# Altium footprint library PCB Library.PcbLib: 32 footprints (part 1 of 2)
Each footprint in its own frame and in the unit in brackets; x right, y up, seen from the top. Pads: shape width x height; smd on the part's side, far side on the other; paste and mask are expansions set on the pad; w line width, h text height; cw(c..) or ccw(c..) is an arc to the next point about the centre after c.
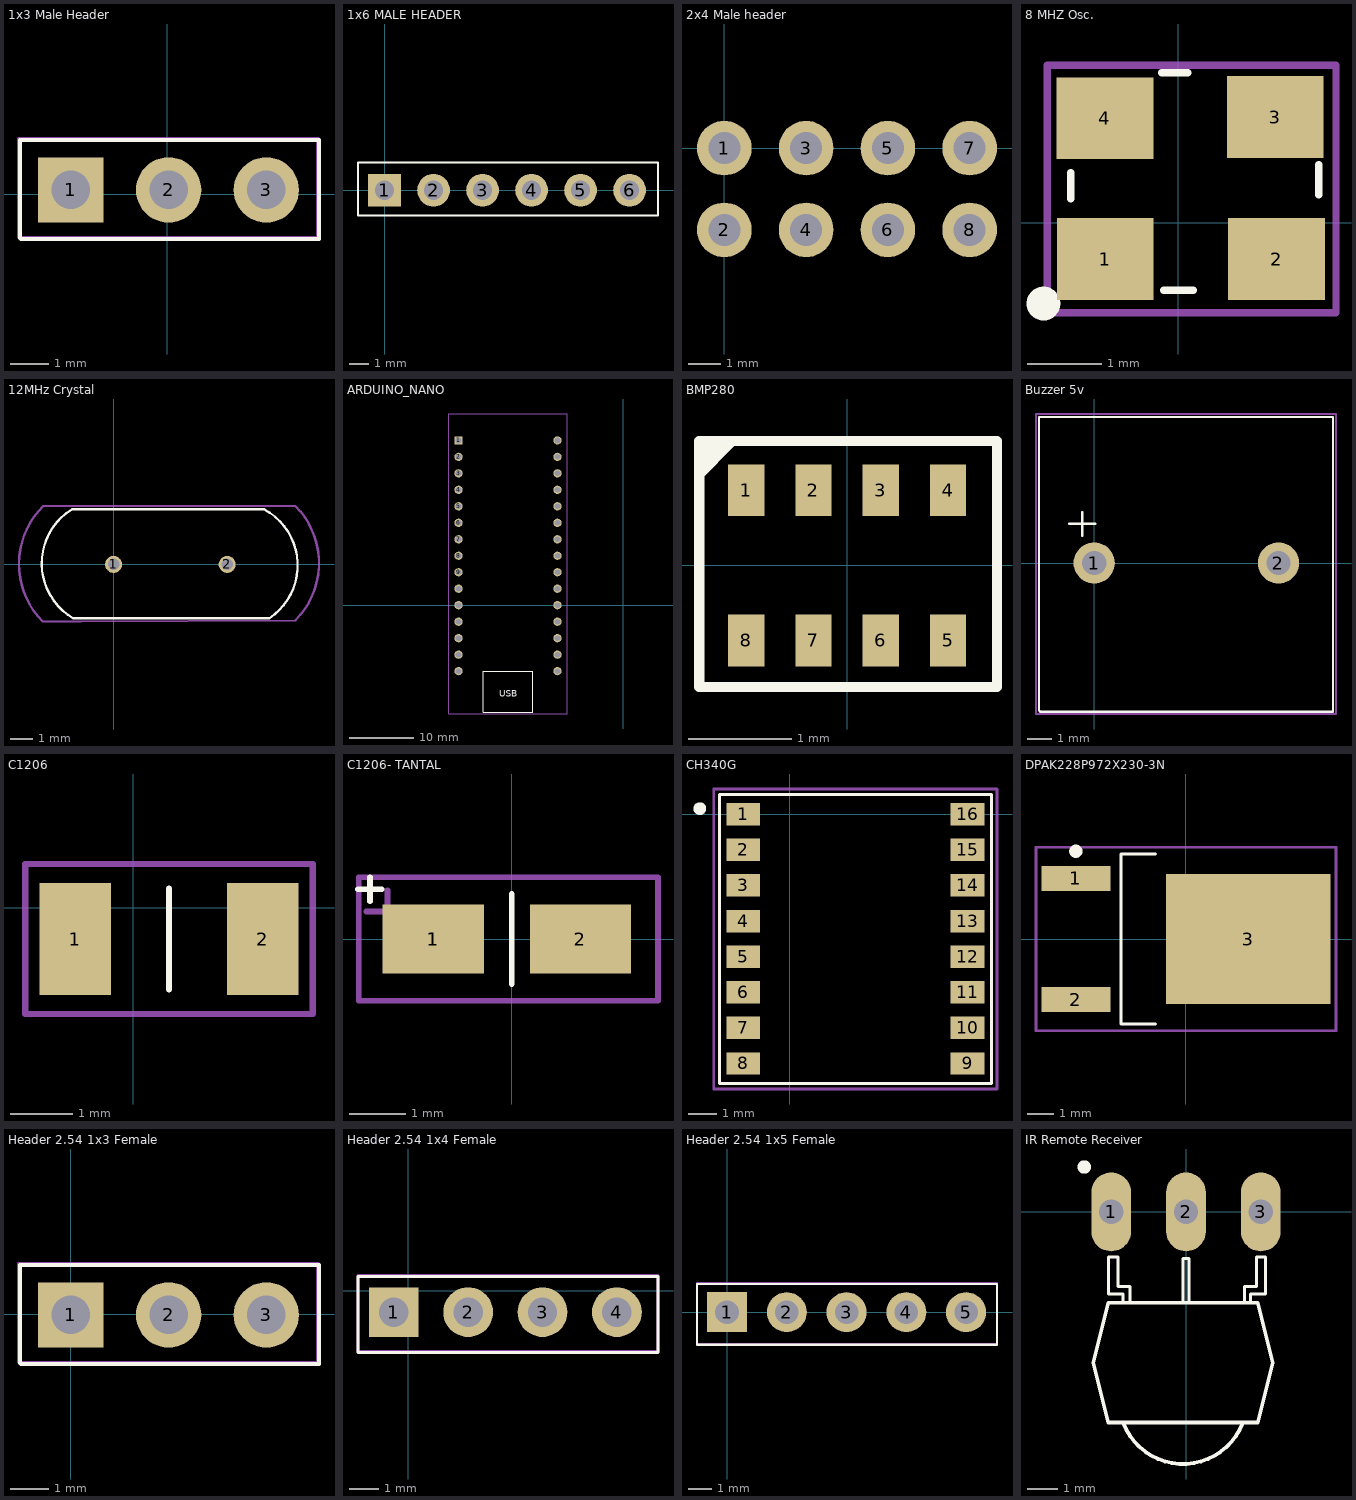
[diagram p0: the footprints below, top view; thin cyan lines are the x and y axes]

## 1x3 Male Header [mm]
pads (3):
  rect 1.7x1.7 hole 1 mask+0.05: 1(-2.499,0.111)
  round 1.7 hole 1 mask+0.05: 2(0.041,0.111) 3(2.581,0.111)
Top Overlay:
  lines w0.1: -3.824,-1.139 -3.799,-1.164 3.951,-1.164 3.951,1.411 -3.824,1.411 -3.824,-1.139
Mechanical 3:
  lines w0.1: -3.849,-1.114 -3.849,1.436 3.926,1.436 3.926,-1.139 -3.824,-1.139 -3.849,-1.114
3D body "User Library-1x3 TH Pitch 2_54mm.step": height 10.25, standoff -2.45, extent -3.769,-1.159 3.851,1.381

## 1x6 MALE HEADER [mm]
pads (6):
  rect 1.7x1.7 hole 1: 1(0,0)
  round 1.7 hole 1: 2(2.54,0) 3(5.08,0) 4(7.62,0) 5(10.16,0) 6(12.7,0)
Top Overlay:
  lines w0.1: -1.375,-1.3 14.175,-1.3 14.175,1.425 -1.375,1.425 -1.375,-1.3
3D body "User Library-1x6 TH Pitch 2_54mm.step": height 9.5, standoff -3.2, extent -1.245,-1.215 13.995,1.325

## 2x4 Male header [mm]
pads (8):
  round 1.7 hole 1 mask+0.05: 1(0,0) 2(0,-2.54) 3(2.54,0) 4(2.54,-2.54) 5(5.08,0) 6(5.08,-2.54) 7(7.62,0) 8(7.62,-2.54)
3D body "User Library-2_54mm Male Header (4x2).STEP": height 8.84, standoff -2.7, extent -1.28,-3.78 8.88,1.2

## 8 MHZ Osc. [mm]
pads (4):
  rect 1.3x1.1 smd mask+0.05: 1(-0.981,-0.49) 2(1.319,-0.49) 3(1.303,1.417) 4(-0.986,1.401)
Top Overlay:
  circle w0.254: c-1.812,-1.089 r0.1
  lines w0.1: -1.445,0.318 -1.445,0.672 ; -0.224,2.01 0.13,2.01 ; -0.199,-0.911 0.201,-0.911 ; 1.884,0.376 1.884,0.776
Mechanical 3:
  circle w0.254: c-1.216,-0.524 r0.1
  lines w0.1: -1.761,-1.211 -1.761,2.113 2.118,2.113 2.118,-1.211 -1.761,-1.211
3D body "ASE3.STEP": height 1.22, standoff -0.03, extent -1.379,-0.641 1.821,1.859

## 12MHz Crystal [mm]
pads (2):
  round 0.75 hole 0.5 mask+0.05: 1(0,0)
  round 0.75 hole 0.5: 2(5,0)
Top Overlay:
  lines w0.1: 6.625,2.425 -1.836,2.425 ccw(c-0.365,0.04) -1.786,-2.375 6.85,-2.375 ccw(c5.302,-0.04) 6.633,2.425
Mechanical 3:
  lines w0.1: -3.125,-2.516 cw(c-0.567,0.017) -3.1,2.575 -1.425,2.575 8,2.575 cw(c5.479,0.055) 8,-2.466 -1.45,-2.516 -3.125,-2.516
3D body "User Library-HC49S.STEP": height 3.63, standoff -1.97, extent -3.111,-2.322 8.061,2.35

## ARDUINO_NANO [mil]
pads (30):
  rect 50x50 hole 35 mask+2: 1(-1000,1000)
  round 50 hole 35 mask+2: 2(-1000,900) 3(-1000,800) 4(-1000,700) 5(-1000,600) 6(-1000,500) 7(-1000,400) 8(-1000,300) 9(-1000,200) 10(-1000,100) 11(-1000,0) 12(-1000,-100) 13(-1000,-200) 14(-1000,-300) 15(-1000,-400) 16(-400,-400) 17(-400,-300) 18(-400,-200) 19(-400,-100) 20(-400,0) 21(-400,100) 22(-400,200) 23(-400,300) 24(-400,400) 25(-400,500) 26(-400,600) 27(-400,700) 28(-400,800) 29(-400,900) 30(-400,1000)
Top Overlay:
  lines w3.94: -850,-650 -850,-620 -850,-400 -550,-400 -550,-620 -550,-650 -850,-650
  text "USB" at -754.09,-554.09 h40
Mechanical 3:
  lines w3.94: -1060,-660 -340,-660 -340,1160 -1060,1160 -1060,-620 -1060,-660
3D body "User Library-arduino_nano.STEP": height 647.64, standoff -84.65, extent -1055.12,-619.09 -346.46,1152.56

## BMP280 [mm]
pads (8):
  rect 0.35x0.5 smd mask+0.05: 1(-0.975,0.725) 2(-0.325,0.725) 3(0.325,0.725) 4(0.975,0.725) 5(0.975,-0.725) 6(0.325,-0.725) 7(-0.325,-0.725) 8(-0.975,-0.725)
Top Overlay:
  region: -1.045,1.201 -1.451,0.796 -1.451,1.18 -1.429,1.201
  lines w0.1: -1.429,-1.175 1.448,-1.175 1.448,1.201 -1.429,1.201 -1.429,-1.175
3D body "User Library-BMP280.step": height 0.95, standoff -0.01, extent -1.243,-1 1.257,1

## Buzzer 5v [mm]
pads (2):
  round 1.7 hole 1 mask+0.05: 1(0,0) 2(7.6,0)
Top Overlay:
  lines w0.1: -1.025,1.625 0.05,1.625 ; -0.5,1.125 -0.5,2.1 ; -2.275,-6.075 -2.275,6.025 9.85,6.025 9.85,-6.125 -2.225,-6.125 -2.275,-6.075
Mechanical 3:
  lines w0.1: -2.4,-6.225 -2.4,6.15 9.975,6.15 9.975,-6.225 -2.4,-6.225
3D body "cem-1205c.stp": height 9.5, standoff -4.5, extent -2.2,-6.05 9.8,5.95

## C1206 [mm]
pads (2):
  rect 1.15x1.8 smd mask+0.05: 1(-0.925,-0.5) 2(2.075,-0.5)
Top Overlay:
  lines w0.1: 0.575,-1.305 0.575,0.305
Mechanical 3:
  lines w0.1: -1.725,-1.7 -1.725,0.7 2.875,0.7 2.875,-1.7 -1.725,-1.7
3D body "1206CAP.step": height 1, standoff 0, extent -1.025,-1.3 2.175,0.3

## C1206- TANTAL [mm]
pads (3):
  rect 1.8x1.23 smd mask+0.05: 1(-1.4,0) 1(-1.4,0) 2(1.22,0)
Top Overlay:
  lines w0.1: -2.738,0.888 -2.313,0.888 ; -2.525,0.675 -2.525,1.1 ; 0,-0.8 0,0.8
Mechanical 3:
  lines w0.1: -2.594,0.489 -1.832,0.489 ; -2.213,0.108 -2.213,0.87 ; -2.725,-1.1 2.6,-1.1 2.6,1.1 -2.725,1.1 -2.725,-1.1
3D body "User Library-CaseA_3216-18.step": height 1.62, standoff 0.02, extent -1.7,-0.8 1.5,0.8

## CH340G [mm]
pads (16):
  rect 1.2x0.8 smd mask+0.1: 1(-1.65,0) 2(-1.65,-1.27) 3(-1.65,-2.54) 4(-1.65,-3.81) 5(-1.65,-5.08) 6(-1.65,-6.35) 7(-1.65,-7.62) 8(-1.65,-8.89) 9(6.35,-8.89)
  rect 1.2x0.8 smd: 10(6.35,-7.62) 11(6.35,-6.35) 12(6.35,-5.08) 13(6.35,-3.81) 14(6.35,-2.54) 15(6.35,-1.27) 16(6.35,0)
Top Overlay:
  circle w0.254: c-3.2,0.2 r0.1
  lines w0.1: -2.5,-9.6 7.2,-9.6 7.2,0.7 -2.5,0.7 -2.5,-9.6
Mechanical 3:
  lines w0.1: -2.7,-9.8 7.4,-9.8 7.4,0.9 -2.7,0.9 -2.7,-9.8
3D body "User Library-CH340G.step": height 1.5, standoff 0, extent -1.955,-9.5 6.755,0.5

## DPAK228P972X230-3N [mm] "D-PAK, 3-Pads, Body 6,40x6,56mm (max), IPC Medium Density"
height 2.3
pads (3):
  rect 2.6x0.95 smd mask+0.05: 1(-4.15,2.28) 2(-4.15,-2.28)
  rect 6.2x4.9 smd mask+0.05: 3(2.35,0)
Top Overlay:
  circle w0.25: c-4.15,3.305 r0.125
  lines w0.1: -1.15,-3.2 -2.45,-3.2 -2.45,3.2 -1.15,3.2
Mechanical 3:
  lines w0.1: -0.5,0 0.5,0 ; 0,-0.5 0,0.5 ; -5.65,-3.45 5.65,-3.45 5.65,3.45 -5.65,3.45 -5.65,-3.45
3D body: height 2.3, standoff 1, extent -2.5,-3.2 4.1,3.2

## Header 2.54 1x3 Female [mm]
pads (3):
  rect 1.7x1.7 hole 1 mask+0.05: 1(0,-0.025)
  round 1.7 hole 1 mask+0.05: 2(2.54,-0.025) 3(5.08,-0.025)
Top Overlay:
  lines w0.1: -1.325,-1.275 -1.325,1.275 6.45,1.275 6.45,-1.3 -1.3,-1.3 -1.325,-1.275
Mechanical 3:
  lines w0.1: -1.35,-1.25 -1.325,-1.275 6.425,-1.275 6.425,1.3 -1.35,1.3 -1.35,-1.25
3D body "User Library-ZL262-3SG.step": height 9.1, standoff -2.45, extent -1.26,-1.275 6.36,1.225

## Header 2.54 1x4 Female [mm]
pads (4):
  rect 1.7x1.7 hole 1 mask+0.05: 1(-0.5,-0.725)
  round 1.7 hole 1 mask+0.05: 2(2.04,-0.725) 3(4.58,-0.725) 4(7.12,-0.725)
Top Overlay:
  lines w0.1: -1.725,-2.1 -1.725,0.5 8.525,0.5 8.525,-2.1 -1.725,-2.1
Mechanical 3:
  lines w0.1: -1.725,-2.075 8.525,-2.075 8.525,0.525 -1.725,0.525 -1.725,-2.075
3D body "User Library-ZL262-4SG.step": height 9.1, standoff -2.45, extent -1.68,-2.05 8.48,0.45

## Header 2.54 1x5 Female [mm]
pads (5):
  rect 1.7x1.7 hole 1 mask+0.05: 1(0,0)
  round 1.7 hole 1 mask+0.05: 2(2.54,0) 3(5.08,0) 4(7.62,0) 5(10.16,0)
Top Overlay:
  lines w0.1: -1.275,-1.375 11.475,-1.375 11.475,1.2 -1.275,1.2 -1.275,-1.375
Mechanical 3:
  lines w0.1: -1.275,-1.35 11.475,-1.35 11.475,1.225 -1.275,1.225 -1.275,-1.35
3D body "User Library-ZL262-5SG (1).step": height 9.1, standoff -2.45, extent -1.25,-1.3 11.45,1.2

## IR Remote Receiver [mil]
pads (3):
  oval 52x104 hole 32: 1(-98.43,0) 2(0,0) 3(98.43,0)
Top Overlay:
  circle w9.84: c-133.86,59.06 r3.94
  lines w3.94: -82.68,-119.7 -82.68,-108.27 -101.92,-108.27 -101.92,-59.06 -89.57,-59.06 -89.57,-98.43 -73.82,-98.43 -73.82,-120.08 ; -3.94,-120.08 -3.94,-61.02 3.94,-61.02 3.94,-120.08 ; 76.77,-120.08 76.77,-98.43 92.52,-98.43 92.52,-59.06 104.33,-59.06 104.33,-108.27 84.65,-108.27 84.65,-120.08
  lines w5: -82.45,-277.77 ccw(c-3.94,-247.64) 74.57,-277.77 ; -122.05,-198.43 -102.36,-277.17 -82.68,-277.17 74.8,-277.17 94.49,-277.17 114.17,-198.43 94.49,-119.69 -102.36,-119.69 -122.05,-198.43
3D body "User Library-IR reciver.step": height 244.73, standoff -61.79, extent -122.05,-502.95 114.17,13.01